# Altium footprint library 常用元件封装库.PcbLib: 1310 footprints (part 37 of 83)
Each footprint in its own frame and in the unit in brackets; x right, y up, seen from the top. Pads: shape width x height; smd on the part's side, far side on the other; paste and mask are expansions set on the pad; w line width, h text height; cw(c..) or ccw(c..) is an arc to the next point about the centre after c.
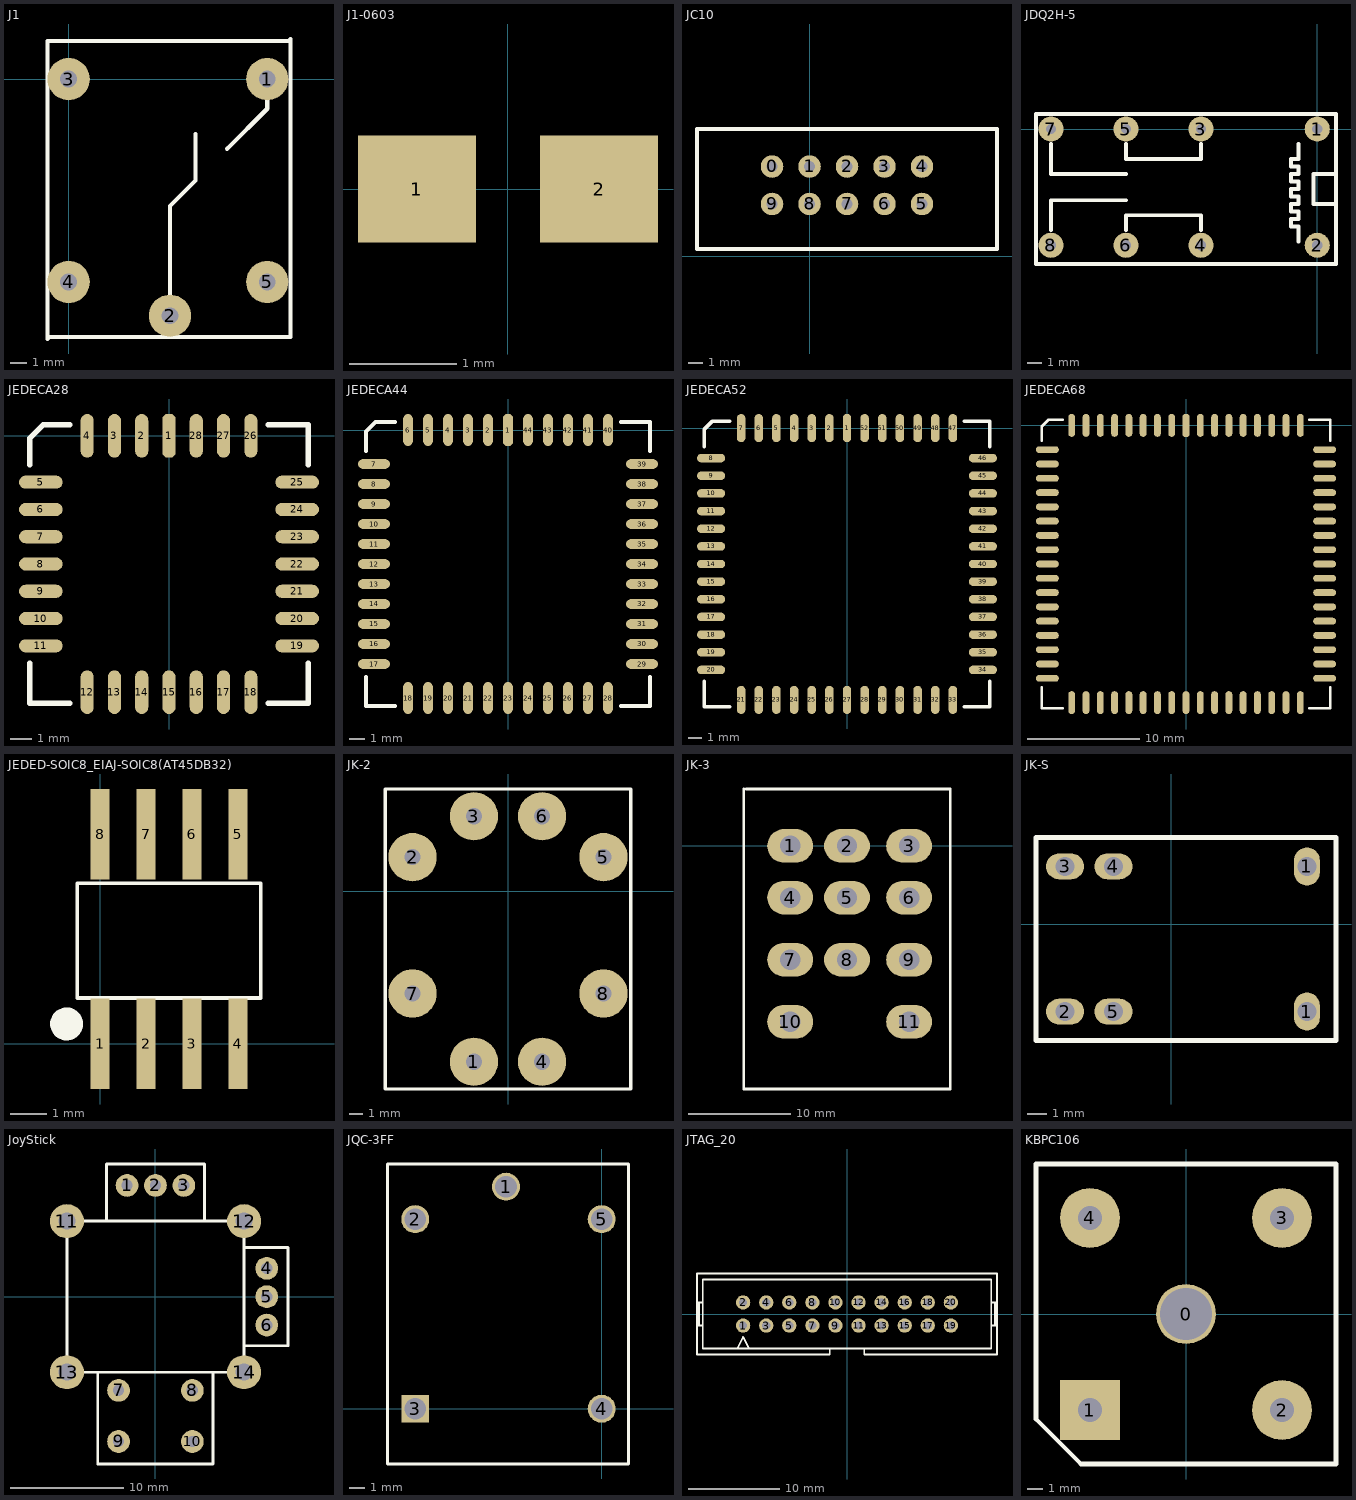
[diagram p36: the footprints below, top view; thin cyan lines are the x and y axes]

## J1 [mil]
pads (5):
  round 100 hole 40: 1(470,0) 2(240,-560) 3(0,0) 4(0,-480) 5(470,-480)
Top Overlay:
  lines w10: 240,-560 240,-300 300,-240 300,-130 ; 375,-165 470,-70 470,0 ; -50,-615 -50,0 -50,90 520,90 525,95 525,-610 -45,-610 -50,-615

## J1-0603 [mm] "Chip Resistor; Body 1.6 x 0.8 mm (LxW typ)"
height 0.6
pads (2):
  rect 1.1x1 smd: 1(-0.85,0) 2(0.85,0)

## JC10 [mil]
pads (10):
  round 60 hole 30: 0(-100,240) 1(0,240) 2(100,240) 3(200,240) 4(300,240) 5(300,140) 6(200,140) 7(100,140) 8(0,140) 9(-100,140)
Top Overlay:
  lines w10: -300,20 500,20 500,340 480,340 -300,340 -300,20

## JDQ2H-5 [mm]
pads (8):
  round 1.7 hole 0.7: 1(0,0) 2(0,-7.874) 3(-7.874,0) 4(-7.874,-7.874) 5(-12.954,0) 6(-12.954,-7.874) 7(-18.034,0) 8(-18.034,-7.874)
Top Overlay:
  lines w0.254: -18.034,-6.858 -18.034,-4.826 -12.954,-4.826 ; -18.034,-1.016 -18.034,-3.048 -12.954,-3.048 ; -12.954,-6.858 -12.954,-5.842 -7.874,-5.842 -7.874,-6.858 ; -12.954,-1.016 -12.954,-2.032 -7.874,-2.032 -7.874,-1.016 ; -1.27,-7.62 -1.27,-6.604 -1.778,-6.604 -1.778,-6.096 -1.27,-6.096 -1.27,-5.588 -1.778,-5.588 -1.778,-5.08 -1.27,-5.08 -1.27,-4.572 -1.778,-4.572 -1.778,-4.064 -1.27,-4.064 -1.27,-3.556 -1.778,-3.556 -1.778,-3.048 -1.27,-3.048 -1.27,-2.54 -1.778,-2.54 -1.778,-2.032 -1.27,-2.032 -1.27,-1.016 ; 1.27,-5.08 -0.254,-5.08 -0.254,-4.572 -0.254,-3.048 1.27,-3.048 ; -19.05,-9.144 1.27,-9.144 1.27,1.016 -19.05,1.016 -19.05,-9.144

## JEDECA28 [mil]
pads (28):
  oct 24x80 smd: 1(0,0)
  oval 24x80 smd: 2(-50,0) 3(-100,0) 4(-150,0) 12(-150,-470) 13(-100,-470) 14(-50,-470) 15(0,-470) 16(50,-470) 17(100,-470) 18(150,-470) 26(150,0) 27(100,0) 28(50,0)
  oval 80x24 smd: 5(-235,-85) 6(-235,-135) 7(-235,-185) 8(-235,-235) 9(-235,-285) 10(-235,-335) 11(-235,-385) 19(235,-385) 20(235,-335) 21(235,-285) 22(235,-235) 23(235,-185) 24(235,-135) 25(235,-85)
Top Overlay:
  lines w10: -255,-417 -255,-490 -182,-490 ; -255,-53 -255,-4 -231,20 -182,20 ; 182,-490 255,-490 255,-417 ; 182,20 255,20 255,-53

## JEDECA44 [mil]
pads (44):
  oct 24x80 smd: 1(0,0)
  oval 24x80 smd: 2(-50,0) 3(-100,0) 4(-150,0) 5(-200,0) 6(-250,0) 18(-250,-670) 19(-200,-670) 20(-150,-670) 21(-100,-670) 22(-50,-670) 23(0,-670) 24(50,-670) 25(100,-670) 26(150,-670) 27(200,-670) 28(250,-670) 40(250,0) 41(200,0) 42(150,0) 43(100,0) 44(50,0)
  oval 80x24 smd: 7(-335,-85) 8(-335,-135) 9(-335,-185) 10(-335,-235) 11(-335,-285) 12(-335,-335) 13(-335,-385) 14(-335,-435) 15(-335,-485) 16(-335,-535) 17(-335,-585) 29(335,-585) 30(335,-535) 31(335,-485) 32(335,-435) 33(335,-385) 34(335,-335) 35(335,-285) 36(335,-235) 37(335,-185) 38(335,-135) 39(335,-85)
Top Overlay:
  lines w10: -355,-617 -355,-690 -282,-690 ; -355,-53 -355,-4 -331,20 -282,20 ; 282,-690 355,-690 355,-617 ; 282,20 355,20 355,-53

## JEDECA52 [mil]
pads (52):
  oct 24x80 smd: 1(0,0)
  oval 24x80 smd: 2(-50,0) 3(-100,0) 4(-150,0) 5(-200,0) 6(-250,0) 7(-300,0) 21(-300,-770) 22(-250,-770) 23(-200,-770) 24(-150,-770) 25(-100,-770) 26(-50,-770) 27(0,-770) 28(50,-770) 29(100,-770) 30(150,-770) 31(200,-770) 32(250,-770) 33(300,-770) 47(300,0) 48(250,0) 49(200,0) 50(150,0) 51(100,0) 52(50,0)
  oval 80x24 smd: 8(-385,-85) 9(-385,-135) 10(-385,-185) 11(-385,-235) 12(-385,-285) 13(-385,-335) 14(-385,-385) 15(-385,-435) 16(-385,-485) 17(-385,-535) 18(-385,-585) 19(-385,-635) 20(-385,-685) 34(385,-685) 35(385,-635) 36(385,-585) 37(385,-535) 38(385,-485) 39(385,-435) 40(385,-385) 41(385,-335) 42(385,-285) 43(385,-235) 44(385,-185) 45(385,-135) 46(385,-85)
Top Overlay:
  lines w10: -405,-717 -405,-790 -332,-790 ; -405,-53 -405,-4 -381,20 -332,20 ; 332,-790 405,-790 405,-717 ; 332,20 405,20 405,-53

## JEDECA68 [mil]
pads (68):
  oct 24x80 smd: 1(0,0)
  oval 24x80 smd: 2(-50,0) 3(-100,0) 4(-150,0) 5(-200,0) 6(-250,0) 7(-300,0) 8(-350,0) 9(-400,0) 27(-400,-970) 28(-350,-970) 29(-300,-970) 30(-250,-970) 31(-200,-970) 32(-150,-970) 33(-100,-970) 34(-50,-970) 35(0,-970) 36(50,-970) 37(100,-970) 38(150,-970) 39(200,-970) 40(250,-970) 41(300,-970) 42(350,-970) 43(400,-970) 61(400,0) 62(350,0) 63(300,0) 64(250,0) 65(200,0) 66(150,0) 67(100,0) 68(50,0)
  oval 80x24 smd: 10(-485,-85) 11(-485,-135) 12(-485,-185) 13(-485,-235) 14(-485,-285) 15(-485,-335) 16(-485,-385) 17(-485,-435) 18(-485,-485) 19(-485,-535) 20(-485,-585) 21(-485,-635) 22(-485,-685) 23(-485,-735) 24(-485,-785) 25(-485,-835) 26(-485,-885) 44(485,-885) 45(485,-835) 46(485,-785) 47(485,-735) 48(485,-685) 49(485,-635) 50(485,-585) 51(485,-535) 52(485,-485) 53(485,-435) 54(485,-385) 55(485,-335) 56(485,-285) 57(485,-235) 58(485,-185) 59(485,-135) 60(485,-85)
Top Overlay:
  lines w10: -505,-917 -505,-990 -432,-990 ; -505,-53 -505,-4 -481,20 -432,20 ; 432,-990 505,-990 505,-917 ; 432,20 505,20 505,-53

## JEDED-SOIC8_EIAJ-SOIC8(AT45DB32) [mm]
pads (8):
  rect 0.52x2.5 smd: 1(0,0) 2(1.27,0) 3(2.54,0) 4(3.81,0) 5(3.81,5.8) 6(2.54,5.8) 7(1.27,5.8) 8(0,5.8)
Top Overlay:
  circle w0.508: c-0.927,0.55 r0.202
  lines w0.102: -0.635,1.27 -0.635,4.445 4.445,4.445 4.445,1.27 -0.635,1.27

## JK-2 [mm]
pads (8):
  round 3.6 hole 1.2: 1(-2.54,-12.7) 2(-7.112,2.54) 3(-2.54,5.588) 4(2.54,-12.7) 5(7.112,2.54) 6(2.54,5.588) 7(-7.112,-7.62) 8(7.112,-7.62)
Top Overlay:
  lines w0.254: -9.144,-14.732 -9.144,7.62 9.144,7.62 9.144,-14.732 -9.144,-14.732

## JK-3 [mil]
pads (11):
  oval 177.16x130 hole 78.74: 1(560,0) 2(780,0) 3(1020,0) 4(560,-200) 5(780,-200) 6(1020,-200) 7(560,-440) 8(780,-440) 9(1020,-440) 10(560,-680) 11(1020,-680)
Top Overlay:
  lines w10: 380,220 380,-940 1180,-940 1180,220 390,220

## JK-S [mm]
pads (6):
  oval 1.35x2 hole 1: 1(7.112,-4.572) 1(7.112,3.048)
  oval 2x1.35 hole 1: 2(-5.588,-4.572) 3(-5.588,3.048) 4(-3.048,3.048) 5(-3.048,-4.572)
Top Overlay:
  lines w0.254: -7.112,3.556 -7.112,4.572 -6.604,4.572 8.636,4.572 8.636,3.556 ; -7.112,4.064 -7.112,-6.096 -6.604,-6.096 8.636,-6.096 8.636,4.064

## JoyStick [mm] "ģ?"
height 20
pads (14):
  round 2 hole 1: 1(-2.5,9.8) 2(0,9.8) 3(2.5,9.8) 4(9.8,2.5) 5(9.8,0) 6(9.8,-2.5) 7(-3.25,-8.25) 8(3.25,-8.25) 9(-3.25,-12.75) 10(3.25,-12.75)
  round 3 hole 1.5: 11(-7.8,6.65) 12(7.8,6.65) 13(-7.8,-6.65) 14(7.8,-6.65)
Top Overlay:
  lines w0.254: -5.08,-6.65 -5.08,-14.732 5.08,-14.732 5.08,-6.65 ; -4.318,6.65 -4.318,11.684 4.318,11.684 4.318,6.65 ; 7.8,-4.318 11.684,-4.318 11.684,4.318 7.8,4.318 ; -7.8,-6.65 -7.8,6.65 7.8,6.65 7.8,-6.65 -7.8,-6.65

## JQC-3FF [mm]
pads (5):
  round 1.8 hole 1.4: 1(-6.158,14.286) 2(-12,12.2) 4(0,0) 5(0,12.2)
  rect 1.8x1.8 hole 1.4: 3(-12,0)
Top Overlay:
  lines w0.2: -13.778,-3.556 -13.778,15.748 1.716,15.748 1.716,-3.556 -13.778,-3.556
3D body "User Library-RAS-1215.STEP": height 3.49, standoff -16.51, extent -13.716,-3.504 1.684,15.696

## JTAG_20 [mil]
pads (20):
  round 62 hole 35: 1(-450,-50) 2(-450,50) 3(-350,-50) 4(-350,50) 5(-250,-50) 6(-250,50) 7(-150,-50) 8(-150,50) 9(-50,-50) 10(-50,50) 11(50,-50) 12(50,50) 13(150,-50) 14(150,50) 15(250,-50) 16(250,50) 17(350,-50) 18(350,50) 19(450,-50) 20(450,50)
Top Overlay:
  lines w8: -650,-50 -625,-50 ; -650,50 -625,50 ; -641.67,-50 -641.67,50 ; -475,-150 -450,-100 -425,-150 ; -339.57,-175 -75,-175 -75,-150 ; -325,-175 -650,-175 -650,175 650,175 650,-175 325,-175 75,-175 75,-150 ; 625,-50 650,-50 ; 625,50 650,50 ; 641.67,-50 641.67,50 ; -75,-150 -625,-150 -625,150 625,150 625,-150 75,-150 ; -75,-150 75,-150

## KBPC106 [mm]
pads (5):
  round 4 hole 3.5: 0(0,0)
  rect 4x4 hole 1.6: 1(-6.4,-6.4)
  round 4 hole 1.6: 2(6.4,-6.4) 3(6.4,6.4) 4(-6.4,6.4)
Top Overlay:
  lines w0.305: -10,-7 -10,10 10,10 10,-10 -7,-10 -10,-7